# Altium footprint library mobinbyn-IC.PcbLib: 41 footprints (part 2 of 3)
Each footprint in its own frame and in the unit in brackets; x right, y up, seen from the top. Pads: shape width x height; smd on the part's side, far side on the other; paste and mask are expansions set on the pad; w line width, h text height; cw(c..) or ccw(c..) is an arc to the next point about the centre after c.
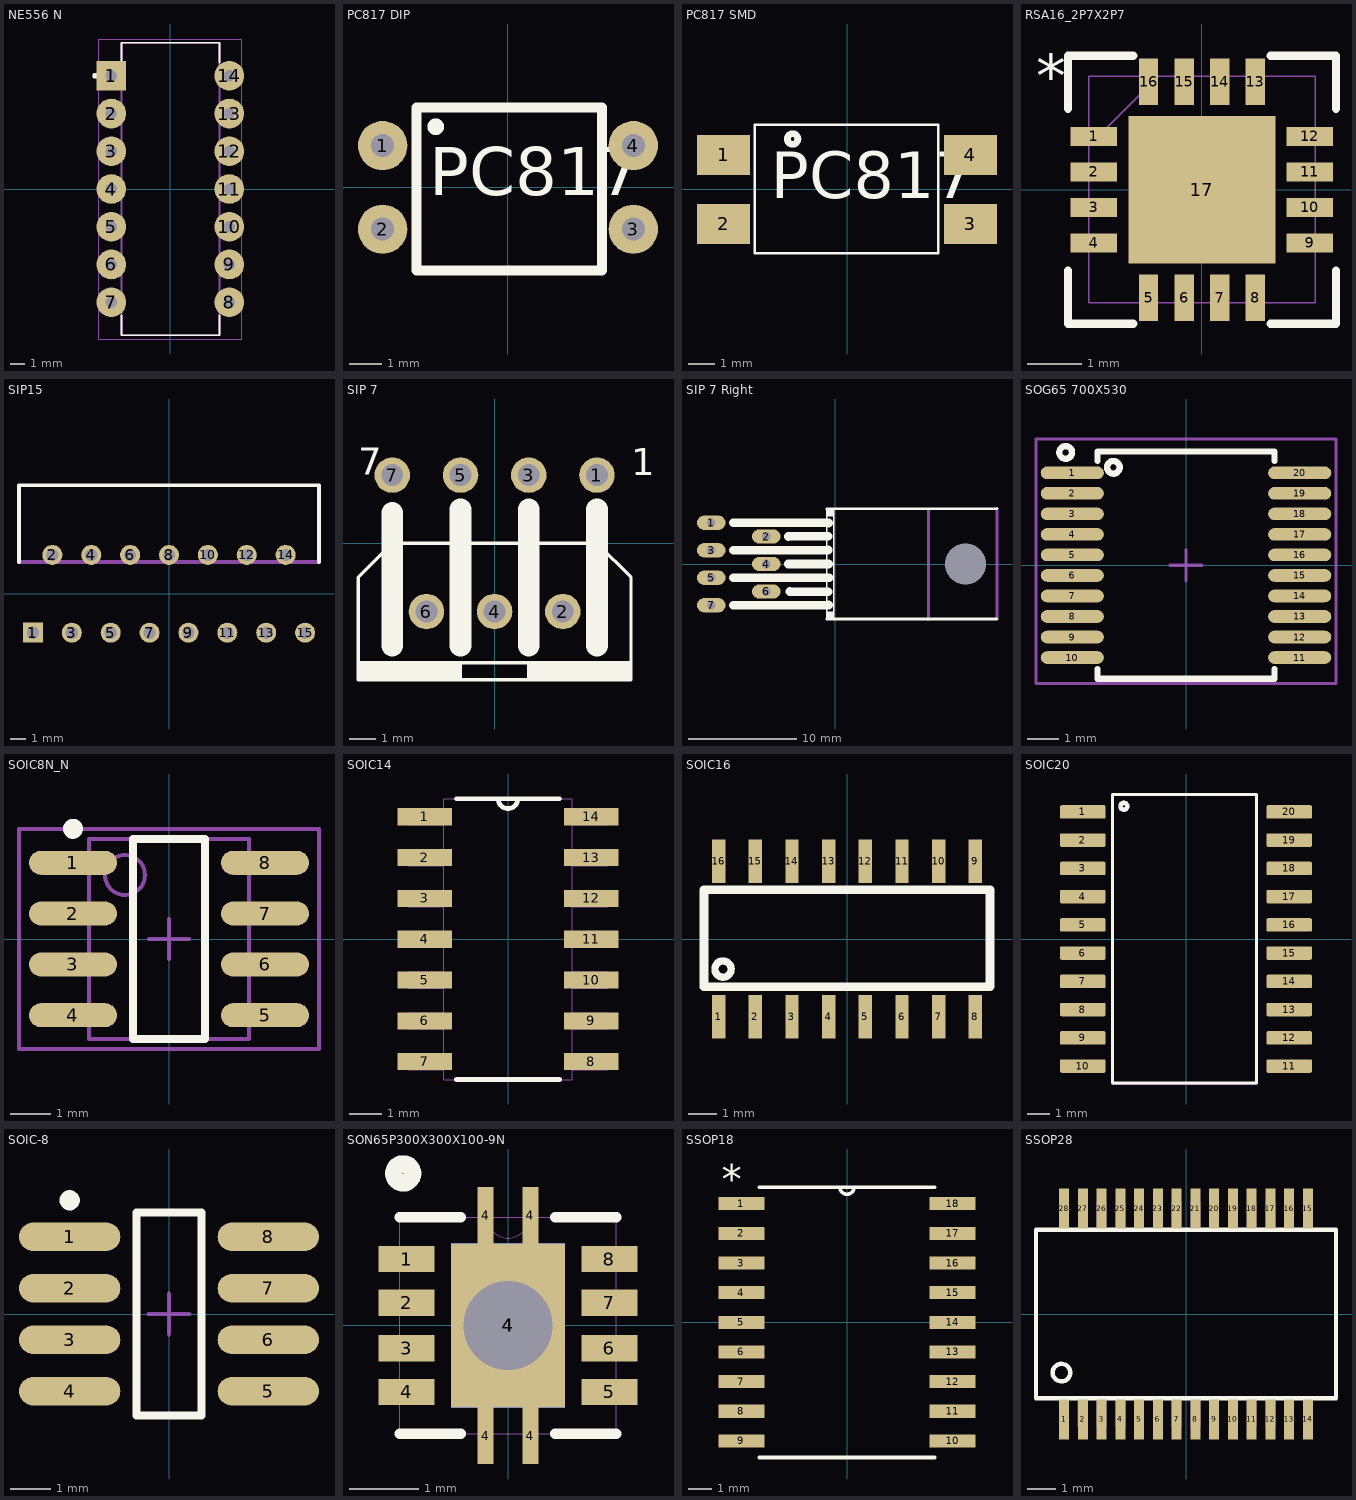
[diagram p1: the footprints below, top view; thin cyan lines are the x and y axes]

## NE556 N [mm]
pads (14):
  rect 2x2 hole 0.77: 1(-3.97,7.62)
  round 2 hole 0.77: 2(-3.97,5.08) 3(-3.97,2.54) 4(-3.97,0) 5(-3.97,-2.54) 6(-3.97,-5.08) 7(-3.97,-7.62) 8(3.97,-7.62) 9(3.97,-5.08) 10(3.97,-2.54) 11(3.97,0) 12(3.97,2.54) 13(3.97,5.08) 14(3.97,7.62)
Top Overlay:
  circle w0.2: c-5.055,7.62 r0.1
  lines w0.127: -3.3,-8.525 -3.3,-9.845 3.3,-9.845 3.3,-8.525 ; -3.3,8.525 -3.3,9.845 3.3,9.845 3.3,8.525
Mechanical 13:
  circle w0.2: c-5.055,7.62 r0.1
  lines w0.127: -3.3,-9.845 3.3,-9.845 3.3,9.845 -3.3,9.845 -3.3,-9.845
Mechanical 15:
  lines w0.05: -4.805,-10.095 4.805,-10.095 4.805,10.095 -4.805,10.095 -4.805,-10.095
3D body "SW3dPS-DIP14-300.step": height 5.08, standoff -2.49, extent -3.935,-9.75 3.935,9.75

## PC817 DIP [mm]
pads (4):
  round 1.5 hole 0.7: 1(-3.81,1.27) 2(-3.81,-1.27) 3(3.81,-1.27) 4(3.81,1.27)
Top Overlay:
  circle w0.254: c-2.197,1.845 r0.127
  lines w0.3: -2.781,-2.524 -1.079,-2.524 2.858,-2.524 2.858,0.838 2.858,2.429 -2.781,2.429 -2.781,-2.524
  text "PC817" at -2.4,-0.72 h2.5
3D body "User Library-DIP4.step": height 3.9, standoff -2.4, extent -3.949,-2.306 3.921,2.288

## PC817 SMD [mm]
pads (4):
  rect 2x1.5 smd: 1(-4.65,1.3) 2(-4.65,-1.3) 3(4.65,-1.3) 4(4.65,1.3)
Top Overlay:
  circle w0.254: c-2.05,1.9 r0.2
  lines w0.1: -3.474,-2.409 -3.474,2.443 3.435,2.443 3.435,-2.409 -3.474,-2.409
  text "PC817" at -2.864,-0.91 h3
3D body "User Library-PC817_Gullwing.STEP": height 3.85, standoff 0, extent -5,-2.29 5,2.29

## RSA16_2P7X2P7 [mm]
pads (17):
  rect 0.85x0.35 smd: 1(-1.975,0.975) 2(-1.975,0.325) 3(-1.975,-0.325) 4(-1.975,-0.975) 9(1.975,-0.975) 10(1.975,-0.325) 11(1.975,0.325) 12(1.975,0.975)
  rect 0.35x0.85 smd: 5(-0.975,-1.975) 6(-0.325,-1.975) 7(0.325,-1.975) 8(0.975,-1.975) 13(0.975,1.975) 14(0.325,1.975) 15(-0.325,1.975) 16(-0.975,1.975)
  rect 2.692x2.692 smd: 17(0,0)
Top Overlay:
  lines w0.152: -2.451,-1.479 -2.451,-2.451 -1.254,-2.451 ; -2.451,1.479 -2.451,2.451 -1.254,2.451 ; 1.254,-2.451 2.451,-2.451 2.451,-1.479 ; 1.254,2.451 2.451,2.451 2.451,1.479
  text "*" at -3.035,1.681 h0.79
Mechanical 1:
  lines w0.025: -2.07,0.8 -0.8,2.07 ; -2.07,-2.07 -2.07,2.07 2.07,2.07 2.07,-2.07 -2.07,-2.07
  text "*" at -1.296,1.3 h0.79
3D body "User Library-VQFN 16-Pin 0_5mm Pitch RVA (S-PVQFN-N16).step": height 1, standoff 0, extent -1.8,-1.8 1.8,1.8

## SIP15 [mm]
pads (15):
  rect 1.308x1.308 hole 0.8: 1(-8.89,-2.54)
  round 1.308 hole 0.8: 2(-7.62,2.54) 3(-6.35,-2.54) 4(-5.08,2.54) 5(-3.81,-2.54) 6(-2.54,2.54) 7(-1.27,-2.54) 8(0,2.54) 9(1.27,-2.54) 10(2.54,2.54) 11(3.81,-2.54) 12(5.08,2.54) 13(6.35,-2.54) 14(7.62,2.54) 15(8.89,-2.54)
Top Overlay:
  lines w0.254: -9.8,2.09 -9.8,7.09 9.8,7.09 9.8,2.09
Mechanical 13:
  lines w0.254: -9.8,2.09 9.8,2.09
3D body "SIP15.step": height 23.95, standoff -1.56, extent -9.8,-2.793 9.8,7.072

## SIP 7 [mil]
pads (7):
  round 52 hole 32: 1(150,100) 2(100,-100) 3(50,100) 4(0,-100) 5(-50,100) 6(-100,-100) 7(-150,100)
Top Overlay:
  region: -175,-200.15 -200.31,-200.15 -200.31,-175 -175,-175
  region: 200,-200.01 175.02,-200.01 175.02,-175 200,-175
  region: 175,-200.17 50.09,-200.17 50.09,-175 175,-175
  region: -50,-200.07 -200.13,-200.07 -200.13,-175 -50,-175
  lines w5: -200,-175 -200,-200 -175,-200 ; -200,-175 -200,-50 -150,0 150,0 200,-50 200,-175 ; -200,-175 -175,-175 ; -175,-200 -50,-200 ; -175,-200 -175,-175 ; -175,-175 -50,-175 ; -50,-200 175,-200 ; -50,-200 -50,-175 ; -50,-200 50,-200 50,-175 ; -50,-175 50,-175 ; 50,-175 175,-175 ; 175,-200 200,-200 200,-175 ; 175,-200 175,-175 ; 175,-175 200,-175
  lines w32: -150,-150 -150,45 ; -50,-150 -50,50 ; 50,-150 50,50 ; 150,-150 150,50
  text "1" at 200.17,100.17 h39.37
  text "7" at -200.27,100.27 h39.37

## SIP 7 Right [mil]
pads (8):
  oval 104x52 hole 32: 1(-450,150) 2(-250,100) 3(-450,50) 4(-250,0) 5(-450,-50) 6(-250,-100) 7(-450,-150)
  round 147.64 hole 147.64 unplated: ""(474.41,0)
Top Overlay:
  region: -4.72,-200.17 -29.75,-200.17 -29.75,-175 -4.72,-175
  region: -4.72,175.11 -29.74,175.11 -29.74,200 -4.72,200
  lines w5: -175,-100 -50,-100 ; -29.72,-175 -29.72,-200 -4.72,-200 -4.72,-175 ; -29.72,-175 -29.72,-50 ; -29.72,-175 -4.72,-175 ; -29.72,-50 -29.72,50 -29.72,175 ; -29.72,-50 -20.87,-50 -4.72,-50 ; -29.72,175 -4.72,175 ; -29.72,175 -29.72,200 -4.72,200 -4.72,175 ; -4.72,-175 -4.72,-50 ; -4.72,-50 -4.72,50 -4.72,175
  lines w10: -29.72,-200 588.98,-200.39 ; -29.72,200 588.58,201.57
  lines w32: -370,-149.85 -23.62,-149.21 ; -370,-50 -20.87,-50 ; -370,50.15 -25.2,50.79 ; -370,149.78 -24.02,148.82 ; -170,0 -23.23,0 ; -170,100.42 -25.2,101.18 ; -165,-100 -25.2,-101.18
Mechanical 13:
  lines w10: 339.76,-201.18 339.76,198.82 ; 588.98,-198.43 588.98,201.57

## SOG65 700X530 [mm]
height 7.62
pads (20):
  oval 2x0.4 smd mask+0.075: 1(-3.6,2.925) 2(-3.6,2.275) 3(-3.6,1.625) 4(-3.6,0.975) 5(-3.6,0.325) 6(-3.6,-0.325) 7(-3.6,-0.975) 8(-3.6,-1.625) 9(-3.6,-2.275) 10(-3.6,-2.925) 11(3.6,-2.925) 12(3.6,-2.275) 13(3.6,-1.625) 14(3.6,-0.975) 15(3.6,-0.325) 16(3.6,0.325) 17(3.6,0.975) 18(3.6,1.625) 19(3.6,2.275) 20(3.6,2.925)
Top Overlay:
  circle w0.2: c-3.81,3.57 r0.2
  circle w0.2: c-2.3,3.1 r0.2
  lines w0.2: -2.8,-3.3 -2.8,-3.6 2.8,-3.6 2.8,-3.3 ; -2.8,3.3 -2.8,3.6 2.8,3.6 2.8,3.3
Mechanical 15:
  lines w0.1: -0.5,0 0.5,0 ; 0,-0.5 0,0.5 ; -4.75,-3.75 4.75,-3.75 4.75,4 -4.75,4 -4.75,-3.75
3D body "User Library-SSOP 20 PIN-1.step": height 1.98, standoff -0.01, extent -3.95,-3.665 3.95,3.665

## SOIC8N_N [mm] "SOIC, 8-Leads, Body 4.9x3.9mm, Pitch 1.27mm, IPC Medium Density"
height 1.75
pads (8):
  oval 2.2x0.6 smd: 1(-2.4,1.905) 2(-2.4,0.635) 3(-2.4,-0.635) 4(-2.4,-1.905) 5(2.4,-1.905) 6(2.4,-0.635) 7(2.4,0.635) 8(2.4,1.905)
Top Overlay:
  circle w0.25: c-2.4,2.755 r0.125
  lines w0.2: -0.9,-2.5 -0.9,2.5 0.9,2.5 0.9,-2.5 -0.9,-2.5
Mechanical 13:
  circle w0.1: c-1.1,1.6 r0.5
  lines w0.1: -2,-2.5 -2,2.5 2,2.5 2,-2.5 -2,-2.5
Mechanical 15:
  lines w0.1: -0.5,0 0.5,0 ; 0,-0.5 0,0.5 ; -3.75,-2.75 -3.75,2.75 3.75,2.75 3.75,-2.75 -3.75,-2.75
3D body "User Library-so8-3.SLDPRT": height 1.7, standoff 0, extent -3,-2.45 3,2.45

## SOIC14 [mil]
pads (14):
  rect 67x21 smd: 1(-102,150) 2(-102,100) 3(-102,50) 4(-102,0) 5(-102,-50) 6(-102,-100) 7(-102,-150) 8(102,-150) 9(102,-100) 10(102,-50) 11(102,0) 12(102,50) 13(102,100) 14(102,150)
Top Overlay:
  lines w6: -63,-172 63,-172 ; -63,172 -12,172 ; 63,172 12,172 ; -12,172 ccw(c0,172) 12,172 ; -12,172 12,172
Mechanical 13:
  lines w0: -12,172 ccw(c0,172) 12,172 ; -12,172 -79,172 -79,-172 79,-172 79,172 12,172 ; -12,172 12,172 ; -122,-160 -79,-160 -79,-140 -122,-140 -122,-160 ; -122,-110 -79,-110 -79,-90 -122,-90 -122,-110 ; -122,-60 -79,-60 -79,-40 -122,-40 -122,-60 ; -122,-10 -79,-10 -79,10 -122,10 -122,-10 ; -122,40 -79,40 -79,60 -122,60 -122,40 ; -122,90 -79,90 -79,110 -122,110 -122,90 ; -122,140 -79,140 -79,160 -122,160 -122,140 ; 79,-160 122,-160 122,-140 79,-140 79,-160 ; 79,-110 122,-110 122,-90 79,-90 79,-110 ; 79,-60 122,-60 122,-40 79,-40 79,-60 ; 79,-10 122,-10 122,10 79,10 79,-10 ; 79,40 122,40 122,60 79,60 79,40 ; 79,90 122,90 122,110 79,110 79,90 ; 79,140 122,140 122,160 79,160 79,140
3D body "SOIC14.step": height 68.9, standoff 0, extent -114.17,-168.31 114.18,168.31

## SOIC16 [mm]
pads (16):
  rect 0.46x1.5 smd: 1(-4.445,-2.695) 2(-3.175,-2.695) 3(-1.905,-2.695) 4(-0.635,-2.695) 5(0.635,-2.695) 6(1.905,-2.695) 7(3.175,-2.695) 8(4.445,-2.695) 9(4.445,2.695) 10(3.175,2.695) 11(1.905,2.695) 12(0.635,2.695) 13(-0.635,2.695) 14(-1.905,2.695) 15(-3.175,2.695) 16(-4.445,2.695)
Top Overlay:
  circle w0.254: c-4.293,-1.041 r0.281
  lines w0.3: -4.953,-1.651 -4.953,1.702 4.953,1.702 4.953,-1.651 -1.753,-1.651 -4.953,-1.651
3D body "User Library-so16.STEP": height 1.7, standoff 0, extent -5.095,-3.028 5.105,2.972

## SOIC20 [mm]
pads (20):
  rrect25% 2.06x0.6 smd: 1(-4.64,5.715) 2(-4.64,4.445) 3(-4.64,3.175) 4(-4.64,1.905) 5(-4.64,0.635) 6(-4.64,-0.635) 7(-4.64,-1.905) 8(-4.64,-3.175) 9(-4.64,-4.445) 10(-4.64,-5.715) 11(4.64,-5.715) 12(4.64,-4.445) 13(4.64,-3.175) 14(4.64,-1.905) 15(4.64,-0.635) 16(4.64,0.635) 17(4.64,1.905) 18(4.64,3.175) 19(4.64,4.445) 20(4.64,5.715)
Top Overlay:
  circle w0.2: c-2.794,5.969 r0.151
  lines w0.127: -3.305,-6.471 -3.305,6.503 3.172,6.503 3.172,-6.471 -3.305,-6.471
Mechanical 13:
  circle w0.2: c-2.794,5.969 r0.151
  lines w0.127: -3.302,-6.5 -3.302,6.5 3.175,6.5 3.175,-6.5 -3.302,-6.5
3D body "SOIC20.step": height 2.27, standoff 0.03, extent -4.94,-6.3 5.194,6.3

## SOIC-8 [mm]
pads (8):
  oval 2.5x0.7 smd: 1(-2.45,1.905) 2(-2.45,0.635) 3(-2.45,-0.635) 4(-2.45,-1.905) 5(2.45,-1.905) 6(2.45,-0.635) 7(2.45,0.635) 8(2.45,1.905)
Top Overlay:
  circle w0.25: c-2.45,2.805 r0.125
  lines w0.2: -0.8,-2.5 0.8,-2.5 0.8,2.5 -0.8,2.5 -0.8,-2.5
Mechanical 15:
  lines w0.1: -0.5,0 0.5,0 ; 0,-0.5 0,0.5
3D body "User Library-so8-3.step": height 1.7, standoff 0, extent -3,-2.45 3,2.45

## SON65P300X300X100-9N [mil]
pads (15):
  rect 32x15 smd: 1(-58,38) 2(-58,13) 3(-58,-13) 4(-58,-38) 5(58,-38) 6(58,-13) 7(58,13) 8(58,38)
  rect 9.06x32.48 smd: 4(-12.8,-62.99) 4(-12.8,62.99) 4(12.8,-62.99) 4(12.8,62.99)
  rect 65x94 smd: 4(0,0)
  round 51.18 hole 51.18: 4(0,0)
  rect 65x94 smd far side: 4(0,0)
Top Overlay:
  circle w10: c-60,87 r5.39
  lines w6: -62,-62 -27,-62 ; -62,62 -27,62 ; 27,-62 62,-62 ; 27,62 62,62
Mechanical 1:
  lines w0: -12,62 ccw(c0,62) 12,62 ; -12,62 -62,62 -62,-62 62,-62 62,62 12,62 ; -12,62 12,62
3D body "User Library-DRB(S-PVSON-N8).STEP": height 39.37, standoff -1.97, extent -59.84,-59.83 59.84,59.84

## SSOP18 [mil]
pads (18):
  rect 78x22 smd: 1(-178,200) 2(-178,150) 3(-178,100) 4(-178,50) 5(-178,0) 6(-178,-50) 7(-178,-100) 8(-178,-150) 9(-178,-200) 10(178,-200) 11(178,-150) 12(178,-100) 13(178,-50) 14(178,0) 15(178,50) 16(178,100) 17(178,150) 18(178,200)
Top Overlay:
  lines w6: -148,-228 148,-228 ; -148,228 148,228 ; -12,228 ccw(c0,228) 12,228
  text "*" at -211,217 h50
3D body "step_temp.STEP": height 104.33, standoff 0, extent -202.75,-227.36 202.76,227.37

## SSOP28 [mil]
pads (28):
  rect 13.7x55 smd: 1(-166.34,-143.94) 2(-140.75,-143.94) 3(-115.16,-143.94) 4(-89.57,-143.94) 5(-63.98,-143.94) 6(-38.39,-143.94) 7(-12.8,-143.94) 8(12.8,-143.94) 9(38.39,-143.94) 10(63.98,-143.94) 11(89.57,-143.94) 12(115.16,-143.94) 13(140.75,-143.94) 14(166.34,-143.94) 15(166.34,143.94) 16(140.75,143.94) 17(115.16,143.94) 18(89.57,143.94) 19(63.98,143.94) 20(38.39,143.94) 21(12.8,143.94) 22(-12.8,143.94) 23(-38.39,143.94) 24(-63.98,143.94) 25(-89.57,143.94) 26(-115.16,143.94) 27(-140.75,143.94) 28(-166.34,143.94)
Top Overlay:
  circle w6: c-170,-80 r12
  lines w6: -204.72,-115.16 204.72,-115.16 204.72,115.16 -204.72,115.16 -204.72,-115.16
Mechanical 13:
  region: -159.94,116.98 -173.07,116.98 -173.07,153.54 -159.94,153.54
  region: -159.94,-153.75 -172.97,-153.75 -172.97,-116.76 -159.94,-116.76
  region: -134.35,-153.85 -147.44,-153.85 -147.44,-116.76 -134.35,-116.76
  region: -108.76,-153.71 -121.69,-153.71 -121.69,-116.76 -108.76,-116.76
  region: -134.35,116.95 -147.39,116.95 -147.39,153.54 -134.35,153.54
  region: -108.76,116.91 -121.71,116.91 -121.71,153.54 -108.76,153.54
  region: -83.17,116.95 -96.12,116.95 -96.12,153.54 -83.17,153.54
  region: -57.58,117.07 -70.56,117.07 -70.56,153.54 -57.58,153.54
  region: -31.99,116.83 -44.81,116.83 -44.81,153.54 -31.99,153.54
  region: -6.4,116.93 -19.22,116.93 -19.22,153.54 -6.4,153.54
  region: 19.19,116.99 6.41,116.99 6.41,153.54 19.19,153.54
  region: 44.78,117.11 32.09,117.11 32.09,153.54 44.78,153.54
  region: 70.37,117.08 57.74,117.08 57.74,153.54 70.37,153.54
  region: 95.96,117.04 83.37,117.04 83.37,153.54 95.96,153.54
  region: 121.56,117.16 109.14,117.16 109.14,153.54 121.56,153.54
  region: 147.15,116.93 134.55,116.93 134.55,153.54 147.15,153.54
  region: 172.74,116.95 160.2,116.95 160.2,153.54 172.74,153.54
  region: -83.17,-153.59 -96,-153.59 -96,-116.76 -83.17,-116.76
  region: -57.58,-153.74 -70.46,-153.74 -70.46,-116.76 -57.58,-116.76
  region: -31.99,-153.61 -44.8,-153.61 -44.8,-116.76 -31.99,-116.76
  region: -6.4,-153.9 -19.24,-153.9 -19.24,-116.76 -6.4,-116.76
  region: 19.19,-153.75 6.41,-153.75 6.41,-116.76 19.19,-116.76
  region: 44.78,-153.77 32.04,-153.77 32.04,-116.76 44.78,-116.76
  region: 70.37,-153.89 57.71,-153.89 57.71,-116.76 70.37,-116.76
  region: 95.96,-153.84 83.33,-153.84 83.33,-116.76 95.96,-116.76
  region: 121.56,-153.96 109.06,-153.96 109.06,-116.76 121.56,-116.76
  region: 147.15,-153.89 134.66,-153.89 134.66,-116.76 147.15,-116.76
  region: 172.74,-153.65 160.06,-153.65 160.06,-116.76 172.74,-116.76
3D body "SSOP28.STEP": height 78.06, standoff -0.68, extent -200.79,-155 200.79,152.09